# Altium footprint library Conectores.PcbLib: 68 footprints (part 2 of 5)
Each footprint in its own frame and in the unit in brackets; x right, y up, seen from the top. Pads: shape width x height; smd on the part's side, far side on the other; paste and mask are expansions set on the pad; w line width, h text height; cw(c..) or ccw(c..) is an arc to the next point about the centre after c.
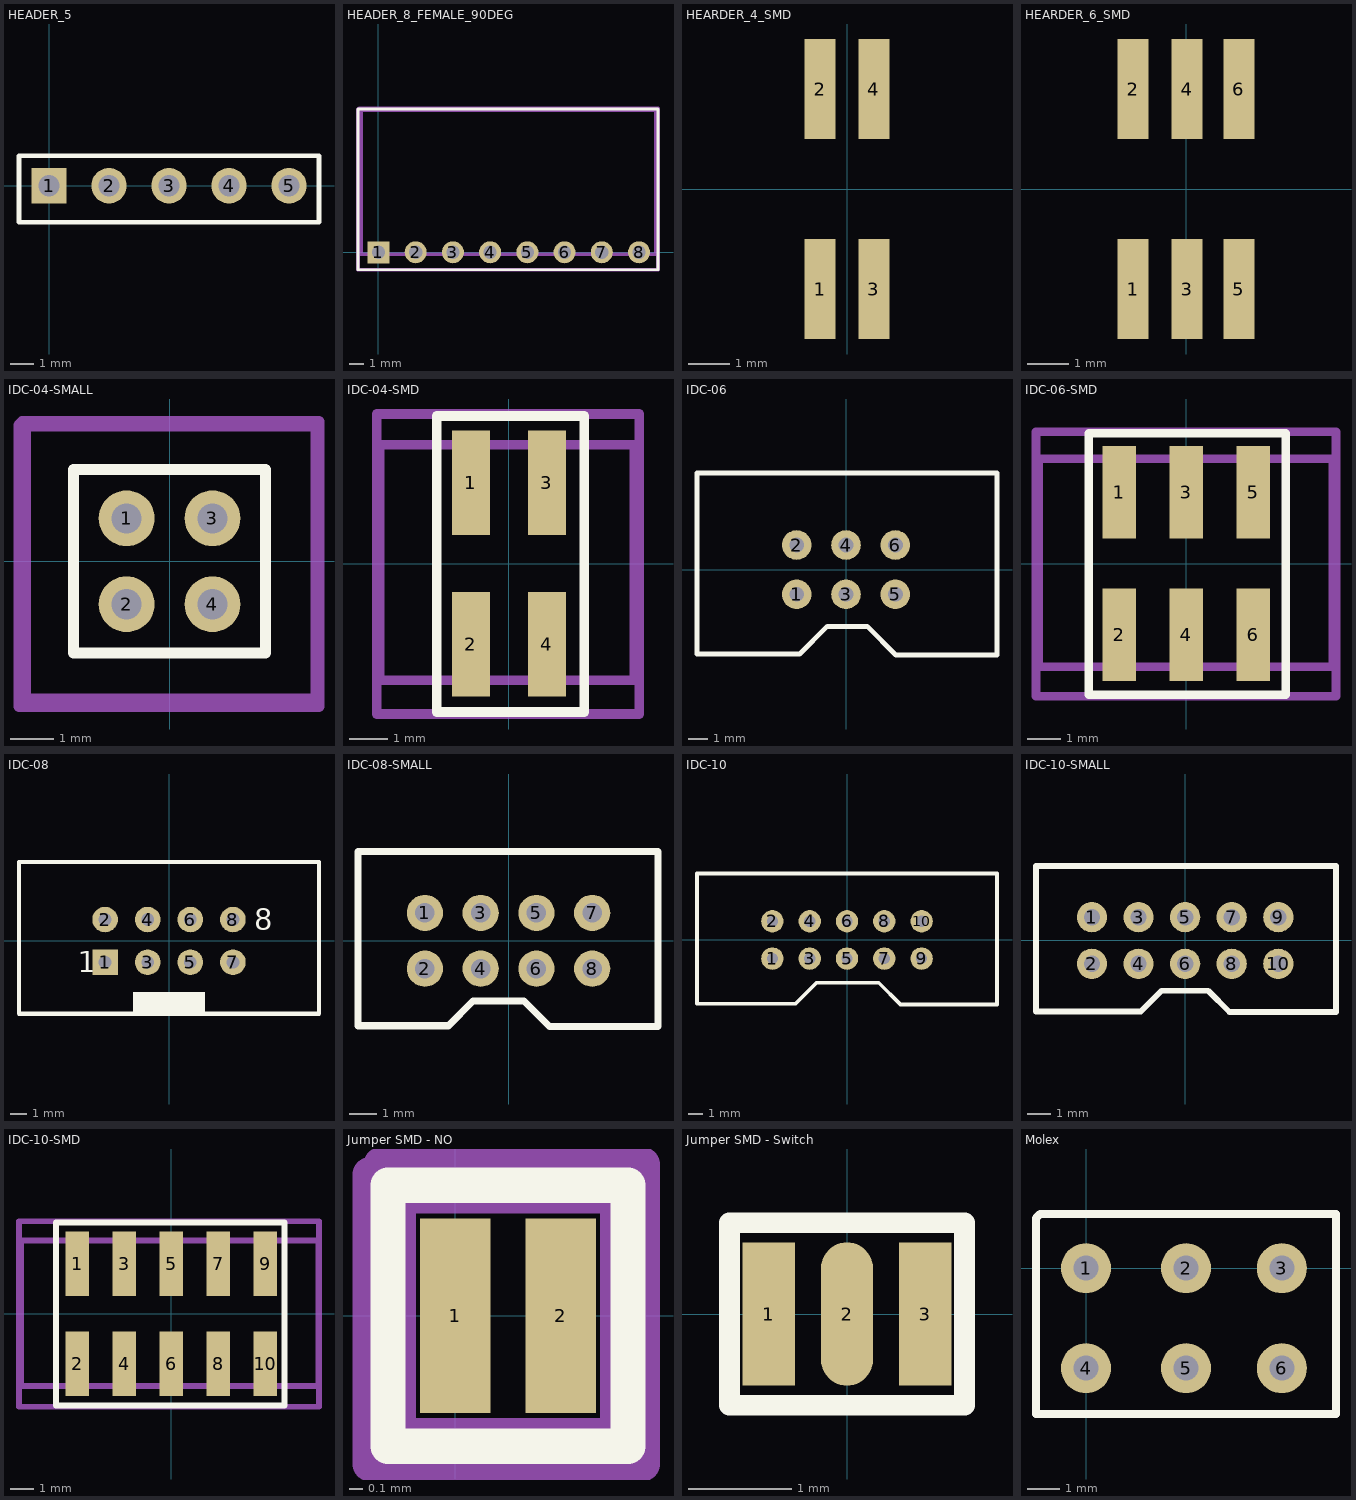
[diagram p1: the footprints below, top view; thin cyan lines are the x and y axes]

## HEADER_5 [mm] "5-pin male header"
pads (5):
  rect 1.5x1.5 hole 0.9: 1(0,0)
  round 1.5 hole 0.9: 2(2.54,0) 3(5.08,0) 4(7.62,0) 5(10.16,0)
Top Overlay:
  lines w0.2: -1.27,-1.549 11.43,-1.549 11.43,1.27 -1.27,1.27 -1.27,-1.549
3D body: height 8.92, standoff -3.58, extent -1.27,-1.548 11.43,1.372

## HEADER_8_FEMALE_90DEG [mm] "8-pin female header 90°"
pads (8):
  rect 1.5x1.5 hole 0.9: 1(0,0)
  round 1.5 hole 0.9: 2(2.54,0) 3(5.08,0) 4(7.62,0) 5(10.16,0) 6(12.7,0) 7(15.24,0) 8(17.78,0)
Top Overlay:
  lines w0.2: -1.397,-1.194 19.075,-1.194 19.075,9.779 -1.397,9.779 -1.397,-1.194
Mechanical 13:
  lines w0.254: -1.194,-0.127 18.923,-0.127 18.923,9.703 -1.194,9.703 -1.194,-0.127
Mechanical 15:
  lines w0.254: -1.397,-1.194 19.075,-1.194 19.075,9.83 -1.321,9.83 -1.397,9.754 -1.397,-1.194
3D body: height 2.55, standoff -3.15, extent -1.42,-0.239 19.15,9.821

## HEARDER_4_SMD [mm] "Archer Connectors – M50 - CONN HDR 1.27MM SMD"
pads (4):
  rect 0.74x2.4 smd: 1(-0.648,-2.4) 2(-0.648,2.4) 3(0.648,-2.4) 4(0.648,2.4)
3D body: height 4.5, standoff 0, extent -1.27,-2.853 1.27,2.647

## HEARDER_6_SMD [mm] "Archer Connectors – M50 - CONN HDR 1.27MM SMD"
pads (6):
  rect 0.74x2.4 smd: 1(-1.27,-2.4) 2(-1.27,2.4) 3(0.025,-2.4) 4(0.025,2.4) 5(1.27,-2.4) 6(1.27,2.4)
3D body: height 4.5, standoff 0, extent -1.905,-2.813 1.905,2.687

## IDC-04-SMALL [mm] "4 Positions Header Connector 0.079\" (2.00mm) Through Hole Gold"
pads (4):
  round 1.3 hole 0.7: 1(-1,1) 2(-1,-1) 3(1,1) 4(1,-1)
Top Overlay:
  lines w0.254: -2.235,-2.134 2.235,-2.134 2.235,2.134 -2.235,2.134 -2.235,-2.134
Mechanical 13:
  lines w0.254: -3.353,-3.2 3.404,-3.2 3.404,3.15 -3.353,3.15 -3.353,-3.2
Mechanical 15:
  lines w0.254: -3.505,-3.378 -3.505,3.175 -3.429,3.251 3.48,3.251 3.48,-3.378 -3.505,-3.378
3D body: height 7.45, standoff -1.45, extent -3.325,-3.15 3.325,3.15

## IDC-04-SMD [mm] "4 Positions Header Connector 0.079\" (2.00mm) Surface Mount Gold"
pads (4):
  rect 1x2.75 smd: 1(-1,2.125) 2(-1,-2.125) 3(1,2.125) 4(1,-2.125)
Top Overlay:
  lines w0.254: -1.902,-3.912 1.981,-3.912 1.981,3.886 -1.902,3.886 -1.902,-3.175 -1.902,-3.912
Mechanical 13:
  lines w0.254: -3.401,-3.073 3.302,-3.073 3.302,3.124 -3.401,3.124 -3.401,-3.073
Mechanical 15:
  lines w0.254: -3.477,-3.962 3.429,-3.962 3.429,3.937 -3.477,3.937 -3.477,-3.962
3D body: height 7.45, standoff -0.15, extent -3.299,-3.175 3.351,3.125

## IDC-06 [mil] "IDC connector 6 ways"
pads (6):
  round 60 hole 30: 1(-100,-50) 2(-100,50) 3(0,-50) 4(0,50) 5(100,-50) 6(100,50)
Top Overlay:
  lines w10: -302,-171 -94,-171 -38,-115 43,-115 101,-173 306,-173 306,196 -302,196 -302,-171
3D body: height 359.25, standoff -117.13, extent -297.78,-165.21 303.79,196.01

## IDC-06-SMD [mm] "6 Positions Header Connector 0.079\" (2.00mm) Surface Mount Gold"
pads (6):
  rect 1x2.75 smd: 1(-2,2.125) 2(-2,-2.125) 3(0,2.125) 4(0,-2.125) 5(2,2.125) 6(2,-2.125)
Top Overlay:
  lines w0.254: -2.902,-3.912 -2.902,-3.175 -2.902,3.886 2.972,3.886 2.972,-3.912 -2.902,-3.912
Mechanical 13:
  lines w0.254: -4.401,-3.073 -4.401,3.124 4.369,3.124 4.369,-3.073 -4.401,-3.073
Mechanical 15:
  lines w0.254: -4.477,-3.962 -4.477,3.937 4.47,3.937 4.47,-3.962 -4.477,-3.962
3D body: height 7.6, standoff -0.75, extent -4.325,-3.201 4.325,3.099

## IDC-08 [mil] "IDC connector 8 ways"
pads (8):
  rect 60x60 hole 30: 1(-150,-50)
  round 60 hole 30: 2(-150,50) 3(-50,-50) 4(-50,50) 5(50,-50) 6(50,50) 7(150,-50) 8(150,50)
Top Overlay:
  rectangle: -85,-176.2 85,-120
  lines w10: -352,-171 -88,-171 191,-171 352,-171 352,185 -352,185 -352,-171
  text "1" at -214,-74 h50
  text "8" at 200,26 h50
3D body: height 357.48, standoff -120.87, extent -350,-176 350,186.2

## IDC-08-SMALL [mm] "8 Positions Header Connector 0.079\" (2.00mm) Through Hole Gold"
pads (8):
  round 1.3 hole 0.7: 1(-3,1) 2(-3,-1) 3(-1,1) 4(-1,-1) 5(1,1) 6(1,-1) 7(3,1) 8(3,-1)
Top Overlay:
  lines w0.254: -5.401,-3.048 -2.159,-3.048 -1.27,-2.159 0.559,-2.159 1.473,-3.073 5.359,-3.073 5.359,3.2 -5.401,3.2 -5.401,-3.048
3D body: height 6.45, standoff -2.45, extent -5.325,-3.15 5.325,3.15

## IDC-10 [mil] "IDC connector 10 ways"
pads (10):
  round 60 hole 30: 1(-200,-50) 2(-200,50) 3(-100,-50) 4(-100,50) 5(0,-50) 6(0,50) 7(100,-50) 8(100,50) 9(200,-50) 10(200,50)
Top Overlay:
  lines w10: -402,-171 -138,-171 -82,-115 85,-115 143,-173 402,-173 402,178 -402,178 -402,-171
3D body: height 351.57, standoff -136.61, extent -399.61,-167.32 399.61,181.1

## IDC-10-SMALL [mm] "10 Positions Header Connector 0.079\" (2.00mm) Through Hole Gold"
pads (10):
  round 1.3 hole 0.7: 1(-4,1) 2(-4,-1) 3(-2,1) 4(-2,-1) 5(0,1) 6(0,-1) 7(2,1) 8(2,-1) 9(4,1) 10(4,-1)
Top Overlay:
  lines w0.254: -6.401,-3.048 -1.905,-3.048 -1.016,-2.159 0.991,-2.159 1.905,-3.073 6.477,-3.073 6.477,3.2 -6.401,3.2 -6.401,-3.048
3D body: height 6.45, standoff -2.45, extent -6.325,-3.15 6.325,3.15

## IDC-10-SMD [mm] "10 Positions Header Connector 0.079\" (2.00mm) Surface Mount Gold"
pads (10):
  rect 1x2.75 smd: 1(-4,2.125) 2(-4,-2.125) 3(-2,2.125) 4(-2,-2.125) 5(0,2.125) 6(0,-2.125) 7(2,2.125) 8(2,-2.125) 9(4,2.125) 10(4,-2.125)
Top Overlay:
  lines w0.254: -4.902,-3.912 -4.902,-3.175 -4.902,3.886 4.826,3.886 4.826,-3.708 4.826,-3.912 -4.902,-3.912
Mechanical 13:
  lines w0.254: -6.401,-3.073 -6.401,3.124 6.274,3.124 6.274,-3.073 -6.401,-3.073
Mechanical 15:
  lines w0.254: -6.477,-3.962 -6.477,3.937 6.299,3.937 6.299,-3.962 -6.477,-3.962
3D body: height 7.6, standoff -0.75, extent -6.35,-3.175 6.3,3.125

## Jumper SMD - NO [mil] "1x2 SMD Solder Jumper"
pads (2):
  rect 20x55 smd paste+0: 1(0,0) 2(30,0)
Top Overlay:
  lines w10: -19,-37 -19,37 49,37 49,-37 -19,-37
Mechanical 13:
  lines w10: -16,-34 -16,34 46,34 46,-34 -16,-34
Mechanical 15:
  lines w10: -24,40 -24,-42 53,-42 53,43 -21,43

## Jumper SMD - Switch [mil] "Jumper SMD - Switch (2 positions)"
pads (3):
  rect 20x55 smd: 1(-30,0) 3(30,0)
  oval 20x55 smd: 2(0,0)
Top Overlay:
  lines w8: -45,-35 45,-35 45,35 -45,35 -45,-35

## Molex [mil] "Molex 6 ways 2 rows 90 deg"
pads (6):
  round 60 hole 30: 1(0,0) 2(120,0) 3(235,0) 4(0,-120) 5(120,-120) 6(235,-120)
Top Overlay:
  lines w10: -60,-175 -60,60 -55,65 300,65 300,-175 -60,-175
3D body: height 387.2, standoff -83.27, extent -138.86,-469.88 378.86,12.01